# Altium footprint library 1.20-电感.PcbLib: 72 footprints (part 3 of 5)
Each footprint in its own frame and in the unit in brackets; x right, y up, seen from the top. Pads: shape width x height; smd on the part's side, far side on the other; paste and mask are expansions set on the pad; w line width, h text height; cw(c..) or ccw(c..) is an arc to the next point about the centre after c.
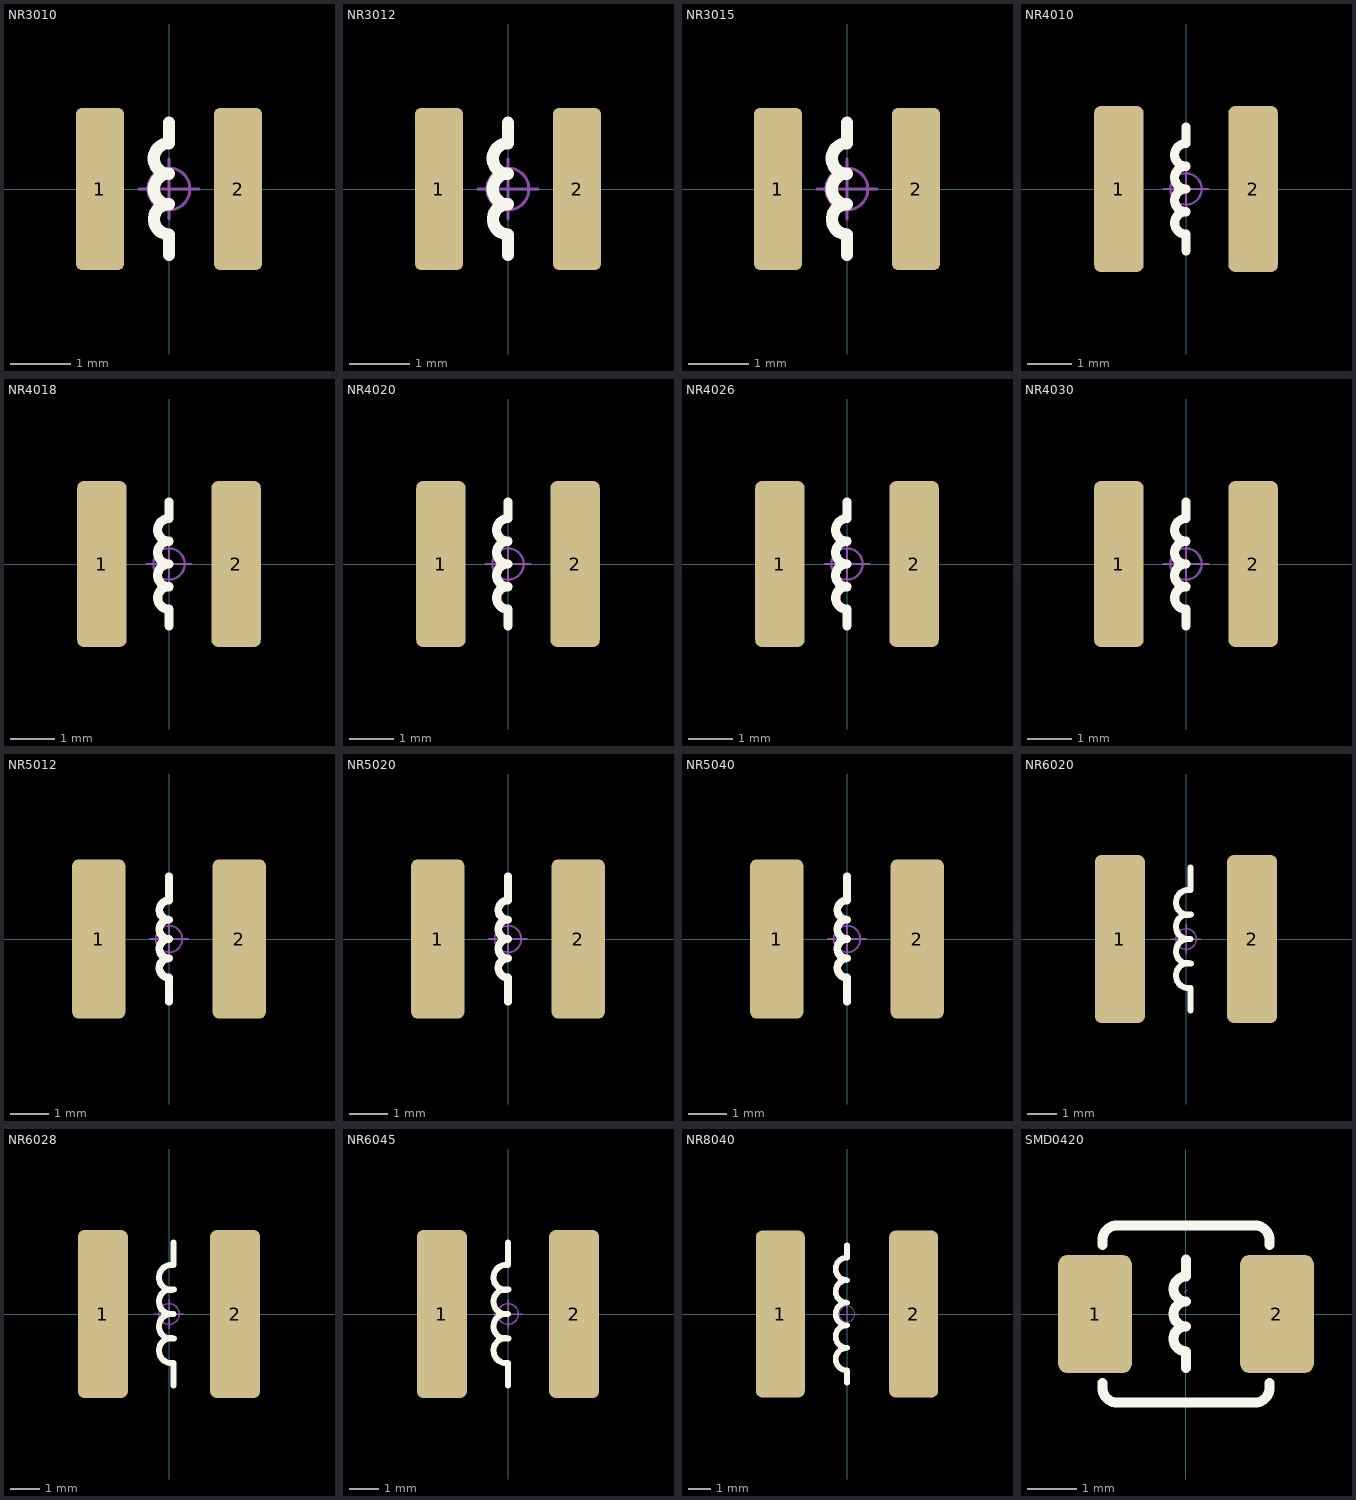
[diagram p2: the footprints below, top view; thin cyan lines are the x and y axes]

## NR3010 [mm] "3.0mm*3.0mm*1.0mm(长*宽*高）"
pads (2):
  rrect25% 0.8x2.7 smd: 1(-1.15,0) 2(1.15,0)
Top Overlay:
  lines w0.203: 0,-1.1 0,-0.758 ; 0,-0.254 cw(c0,0) 0,0.254 cw(c0,0.508) 0,0.762 ; 0.002,-0.758 cw(c0.002,-0.504) 0.002,-0.25 ; 0.002,0.762 0.002,1.104
Mechanical 15:
  circle w0.05: c0,0 r0.35
  lines w0.05: -0.5,0 0.5,0 ; 0,-0.5 0,0.5
3D body "NR3010.STEP": height 1.15, standoff 0.05, extent -1.5,-1.5 1.5,1.5

## NR3012 [mm] "3.0mm*3.0mm*1.2mm(长*宽*高）"
pads (2):
  rrect25% 0.8x2.7 smd: 1(-1.15,0) 2(1.15,0)
Top Overlay:
  lines w0.203: 0,-1.1 0,-0.758 ; 0,-0.254 cw(c0,0) 0,0.254 cw(c0,0.508) 0,0.762 ; 0.002,-0.758 cw(c0.002,-0.504) 0.002,-0.25 ; 0.002,0.762 0.002,1.104
Mechanical 15:
  circle w0.05: c0,0 r0.35
  lines w0.05: -0.5,0 0.5,0 ; 0,-0.5 0,0.5
3D body "NR3012.STEP": height 1.35, standoff 0.05, extent -1.5,-1.5 1.5,1.5

## NR3015 [mm] "3.0mm*3.0mm*1.5mm(长*宽*高）"
pads (2):
  rrect25% 0.8x2.7 smd: 1(-1.15,0) 2(1.15,0)
Top Overlay:
  lines w0.203: 0,-1.1 0,-0.758 ; 0,-0.254 cw(c0,0) 0,0.254 cw(c0,0.508) 0,0.762 ; 0.002,-0.758 cw(c0.002,-0.504) 0.002,-0.25 ; 0.002,0.762 0.002,1.104
Mechanical 15:
  circle w0.05: c0,0 r0.35
  lines w0.05: -0.5,0 0.5,0 ; 0,-0.5 0,0.5
3D body "NR3015.STEP": height 1.6, standoff 0, extent -1.5,-1.5 1.5,1.5

## NR4010 [mm] "4.0mm*4.0mm*1.0mm(长*宽*高）"
pads (2):
  rrect25% 1.1x3.7 smd: 1(-1.5,0) 2(1.5,0)
Top Overlay:
  lines w0.203: 0,-0.508 cw(c0,-0.254) 0,0 cw(c0,0.254) 0,0.508 cw(c0,0.762) 0,1.016 0,1.382 ; 0.002,-1.378 0.002,-1.012 cw(c0.002,-0.758) 0.002,-0.504
Mechanical 15:
  circle w0.05: c0,0 r0.35
  lines w0.05: -0.5,0 0.5,0 ; 0,-0.5 0,0.5
3D body "NR4010.STEP": height 1.1, standoff 0, extent -2,-2 2,2

## NR4018 [mm] "4.0mm*4.0mm*1.8mm(长*宽*高）"
pads (2):
  rrect25% 1.1x3.7 smd: 1(-1.5,0) 2(1.5,0)
Top Overlay:
  lines w0.203: 0,-0.508 cw(c0,-0.254) 0,0 cw(c0,0.254) 0,0.508 cw(c0,0.762) 0,1.016 0,1.382 ; 0.002,-1.378 0.002,-1.012 cw(c0.002,-0.758) 0.002,-0.504
Mechanical 15:
  circle w0.05: c0,0 r0.35
  lines w0.05: -0.5,0 0.5,0 ; 0,-0.5 0,0.5
3D body "NR4018.STEP": height 1.9, standoff 0, extent -2,-2 2,2

## NR4020 [mm] "4.0mm*4.0mm*2.0mm(长*宽*高）"
pads (2):
  rrect25% 1.1x3.7 smd: 1(-1.5,0) 2(1.5,0)
Top Overlay:
  lines w0.203: 0,-0.508 cw(c0,-0.254) 0,0 cw(c0,0.254) 0,0.508 cw(c0,0.762) 0,1.016 0,1.382 ; 0.002,-1.378 0.002,-1.012 cw(c0.002,-0.758) 0.002,-0.504
Mechanical 15:
  circle w0.05: c0,0 r0.35
  lines w0.05: -0.5,0 0.5,0 ; 0,-0.5 0,0.5
3D body "NR4020.STEP": height 2.1, standoff 0, extent -2,-2 2,2

## NR4026 [mm] "4.0mm*4.0mm*2.6mm(长*宽*高）"
pads (2):
  rrect25% 1.1x3.7 smd: 1(-1.5,0) 2(1.5,0)
Top Overlay:
  lines w0.203: 0,-0.508 cw(c0,-0.254) 0,0 cw(c0,0.254) 0,0.508 cw(c0,0.762) 0,1.016 0,1.382 ; 0.002,-1.378 0.002,-1.012 cw(c0.002,-0.758) 0.002,-0.504
Mechanical 15:
  circle w0.05: c0,0 r0.35
  lines w0.05: -0.5,0 0.5,0 ; 0,-0.5 0,0.5
3D body "NR4026.STEP": height 2.7, standoff 0, extent -2,-2 2,2

## NR4030 [mm] "4.0mm*4.0mm*3.0mm(长*宽*高）"
pads (2):
  rrect25% 1.1x3.7 smd: 1(-1.5,0) 2(1.5,0)
Top Overlay:
  lines w0.203: 0,-0.508 cw(c0,-0.254) 0,0 cw(c0,0.254) 0,0.508 cw(c0,0.762) 0,1.016 0,1.382 ; 0.002,-1.378 0.002,-1.012 cw(c0.002,-0.758) 0.002,-0.504
Mechanical 15:
  circle w0.05: c0,0 r0.35
  lines w0.05: -0.5,0 0.5,0 ; 0,-0.5 0,0.5
3D body "NR4030.STEP": height 3.1, standoff 0, extent -2,-2 2,2

## NR5012 [mm] "5.0mm*5.0mm*1.2mm(长*宽*高）"
pads (2):
  rrect25% 1.4x4.2 smd: 1(-1.85,0) 2(1.85,0)
Top Overlay:
  lines w0.203: 0,-1.651 0,-1.016 cw(c0,-0.762) 0,-0.508 cw(c0,-0.254) 0,0 cw(c0,0.254) 0,0.508 cw(c0,0.762) 0,1.016 0,1.651
Mechanical 15:
  circle w0.05: c0,0 r0.35
  lines w0.05: -0.5,0 0.5,0 ; 0,-0.5 0,0.5
3D body "NR5012.STEP": height 1.3, standoff 0, extent -2.5,-2.5 2.5,2.5

## NR5020 [mm] "5.0mm*5.0mm*2.0mm(长*宽*高）"
pads (2):
  rrect25% 1.4x4.2 smd: 1(-1.85,0) 2(1.85,0)
Top Overlay:
  lines w0.203: 0,-1.651 0,-1.016 cw(c0,-0.762) 0,-0.508 cw(c0,-0.254) 0,0 cw(c0,0.254) 0,0.508 cw(c0,0.762) 0,1.016 0,1.651
Mechanical 15:
  circle w0.05: c0,0 r0.35
  lines w0.05: -0.5,0 0.5,0 ; 0,-0.5 0,0.5
3D body "NR5020.STEP": height 2.1, standoff 0, extent -2.5,-2.5 2.5,2.5

## NR5040 [mm] "5.0mm*5.0mm*4.0mm(长*宽*高）"
pads (2):
  rrect25% 1.4x4.2 smd: 1(-1.85,0) 2(1.85,0)
Top Overlay:
  lines w0.203: 0,-1.651 0,-1.016 cw(c0,-0.762) 0,-0.508 cw(c0,-0.254) 0,0 cw(c0,0.254) 0,0.508 cw(c0,0.762) 0,1.016 0,1.651
Mechanical 15:
  circle w0.05: c0,0 r0.35
  lines w0.05: -0.5,0 0.5,0 ; 0,-0.5 0,0.5
3D body "NR5040.STEP": height 4.1, standoff 0, extent -2.5,-2.5 2.5,2.5

## NR6020 [mm] "6.0mm*6.0mm*2.0mm(长*宽*高）"
pads (2):
  rrect25% 1.7x5.7 smd: 1(-2.25,0) 2(2.25,0)
Top Overlay:
  lines w0.203: 0.151,-2.424 0.151,-1.662 cw(c0.082,-1.244) 0.174,-0.831 cw(c0.082,-0.418) 0.151,0 cw(c0.082,0.418) 0.174,0.831 cw(c0.082,1.244) 0.151,1.662 0.151,2.424
Mechanical 15:
  circle w0.05: c0,0 r0.35
  lines w0.05: -0.5,0 0.5,0 ; 0,-0.5 0,0.5
3D body "NR6020.STEP": height 2.1, standoff 0, extent -3,-3 3,3

## NR6028 [mm] "6.0mm*6.0mm*2.8mm(长*宽*高）"
pads (2):
  rrect25% 1.7x5.7 smd: 1(-2.25,0) 2(2.25,0)
Top Overlay:
  lines w0.203: 0.151,-2.424 0.151,-1.662 cw(c0.082,-1.244) 0.174,-0.831 cw(c0.082,-0.418) 0.151,0 cw(c0.082,0.418) 0.174,0.831 cw(c0.082,1.244) 0.151,1.662 0.151,2.424
Mechanical 15:
  circle w0.05: c0,0 r0.35
  lines w0.05: -0.5,0 0.5,0 ; 0,-0.5 0,0.5
3D body "NR6028.STEP": height 2.9, standoff 0, extent -3,-3 3,3

## NR6045 [mm] "6.0mm*6.0mm*4.5mm(长*宽*高）"
pads (2):
  rrect25% 1.7x5.7 smd: 1(-2.25,0) 2(2.25,0)
Top Overlay:
  lines w0.203: 0,-2.424 0,-1.662 cw(c-0.07,-1.244) 0.022,-0.831 cw(c-0.07,-0.418) 0,0 cw(c-0.07,0.418) 0.022,0.831 cw(c-0.07,1.244) 0,1.662 0,2.424
Mechanical 15:
  circle w0.05: c0,0 r0.35
  lines w0.05: -0.5,0 0.5,0 ; 0,-0.5 0,0.5
3D body "NR6045.STEP": height 4.6, standoff 0, extent -3,-3 3,3

## NR8040 [mm] "8.0mm*8.0mm*4.0mm(长*宽*高）"
pads (2):
  rrect25% 2.2x7.5 smd: 1(-3,0) 2(3,0)
Top Overlay:
  lines w0.254: 0,-3.1 0,-2.54 cw(c0,-2.032) 0,-1.524 cw(c0,-1.016) 0,-0.508 cw(c0,0) 0,0.508 cw(c0,1.016) 0,1.524 cw(c0,2.032) 0,2.54 0,3.1
Mechanical 15:
  circle w0.05: c0,0 r0.35
  lines w0.05: -0.5,0 0.5,0 ; 0,-0.5 0,0.5
3D body "NR8040.STEP": height 4.1, standoff 0, extent -4,-4 4,4

## SMD0420 [mm] "一体成型电感，SMD,4.5x4.1x3mm"
pads (2):
  rrect25% 1.5x2.4 smd: 1(-1.85,0) 2(1.85,0)
Top Overlay:
  lines w0.203: -1.7,-1.4 -1.7,-1.5 ccw(c-1.4,-1.5) -1.4,-1.8 0,-1.8 1.4,-1.8 ccw(c1.4,-1.5) 1.7,-1.5 1.7,-1.4 ; -1.7,1.4 -1.7,1.5 cw(c-1.4,1.5) -1.4,1.8 0,1.8 1.4,1.8 cw(c1.4,1.5) 1.7,1.5 1.7,1.4 ; 0,-1.1 0,-0.758 ; 0,-0.254 cw(c0,0) 0,0.254 cw(c0,0.508) 0,0.762 ; 0.002,-0.758 cw(c0.002,-0.504) 0.002,-0.25 ; 0.002,0.762 0.002,1.104
Mechanical 15:
  lines w0.003: -0.025,0.442 0.025,0.493
3D body "744373240033.x_t": height 1.79, standoff -0.01, extent -2.225,-2.03 2.225,2.03